# Altium footprint library bitfury.PcbLib: 41 footprints (part 1 of 3)
Each footprint in its own frame and in the unit in brackets; x right, y up, seen from the top. Pads: shape width x height; smd on the part's side, far side on the other; paste and mask are expansions set on the pad; w line width, h text height; cw(c..) or ccw(c..) is an arc to the next point about the centre after c.
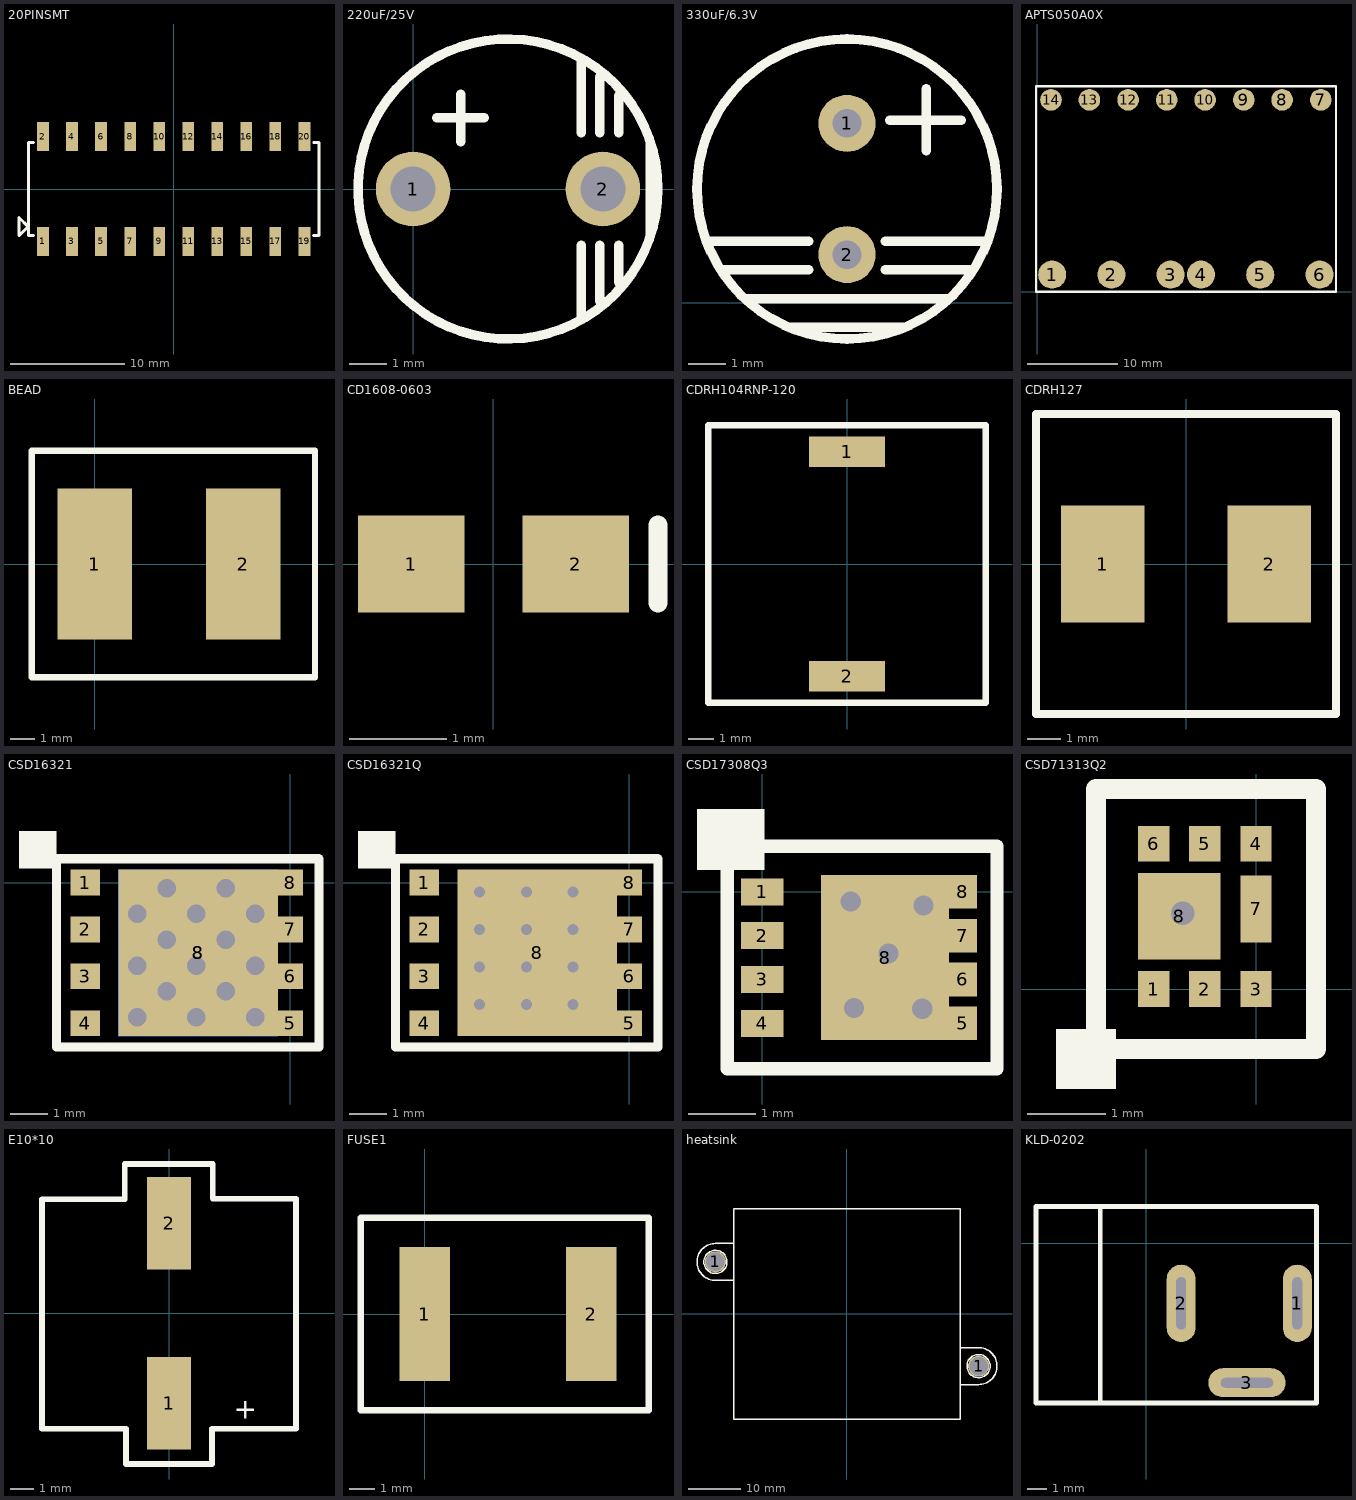
[diagram p0: the footprints below, top view; thin cyan lines are the x and y axes]

## 20PINSMT [mm]
pads (20):
  rect 1.02x2.534 smd: 1(-11.43,-4.573) 2(-11.43,4.573) 3(-8.89,-4.573) 4(-8.89,4.573) 5(-6.35,-4.573) 6(-6.35,4.573) 7(-3.81,-4.573) 8(-3.81,4.573) 9(-1.27,-4.573) 10(-1.27,4.573) 11(1.27,-4.573) 12(1.27,4.573) 13(3.81,-4.573) 14(3.81,4.573) 15(6.35,-4.573) 16(6.35,4.573) 17(8.89,-4.573) 18(8.89,4.573) 19(11.43,-4.573) 20(11.43,4.573)
Top Overlay:
  lines w0.254: -12.741,-3.302 -13.52,-4.082 -13.52,-2.489 -12.708,-3.302 ; -12.243,-4.05 -12.7,-4.05 -12.7,4.05 -12.243,4.05 ; 12.217,-4.05 12.7,-4.05 12.7,4.05 12.243,4.05
3D body: height 6.1, standoff 0, extent -12.548,-3.886 12.522,3.912

## 220uF/25V [mm] "aluminium electrolytic"
height 6
pads (2):
  round 2 hole 1.2: 1(0,0) 2(5.08,0)
Top Overlay:
  circle w0.254: c2.54,0 r4.016
  lines w0.254: 0.635,1.905 1.905,1.905 ; 1.27,1.27 1.27,2.54 ; 4.5,-3.5 4.5,-1.5 ; 4.5,1.5 4.5,3.5 ; 5,-3 5,-1.5 ; 5,1.5 5,3 ; 5.5,-2.5 5.5,-1.5 ; 5.5,1.5 5.5,2.5 ; 6.35,0.635 6.35,-1.27 6.35,1.27

## 330uF/6.3V [mil] "solid capacitors"
height 314.96
pads (2):
  round 60 hole 30: 1(-429.33,188.43) 2(-429.33,50.63)
Top Overlay:
  circle w10: c-429.33,119.53 r157.48
  lines w10: -574.33,64.53 -469.33,64.53 ; -559.33,34.53 -469.33,34.53 ; -534.33,4.53 -324.33,4.53 ; -489.33,-25.47 -369.33,-25.47 ; -389.33,34.53 -299.33,34.53 ; -389.33,64.53 -284.33,64.53 ; -384.33,191.53 -309.33,191.53 ; -346.33,159.53 -346.33,224.53

## APTS050A0X [mm] "DC-DC"
height 10
pads (14):
  round 3.12 smd: 1(1.65,1.91) 2(8.23,1.91) 3(14.81,1.91) 4(18.19,1.91) 5(24.77,1.91) 6(31.37,1.91)
  round 2.4 smd: 7(31.5,21.34) 8(27.2,21.34) 9(22.94,21.34) 10(18.64,21.34) 11(14.38,21.34) 12(10.08,21.34) 13(5.79,21.34) 14(1.52,21.34)
Top Overlay:
  lines w0.254: -0.15,0 -0.15,22.86 33.19,22.86 33.19,0 -0.15,0

## BEAD [mm]
pads (2):
  rect 3x6.1 smd: 1(0,0) 2(6,0)
Top Overlay:
  lines w0.254: -2.54,-4.572 -2.54,4.572 8.89,4.572 8.89,-4.318 8.89,-4.572 -2.54,-4.572

## CD1608-0603 [mm] "Chip Diode; Body 1.6 x 0.8 mm (LxW typ)"
height 0.85
pads (2):
  rect 1.1x1 smd: 1(-0.85,0) 2(0.85,0)
Top Overlay:
  lines w0.2: 1.7,-0.4 1.7,0.4

## CDRH104RNP-120 [mm]
pads (2):
  rect 3x1.2 smd: 1(0,4.45) 2(0,-4.45)
Top Overlay:
  lines w0.254: -5.5,-5.5 -5.5,5.5 5.5,5.5 5.5,-5.5 -5.5,-5.5

## CDRH127 [mm]
pads (2):
  rect 2.5x3.5 smd: 1(-2.5,0) 2(2.5,0)
Top Overlay:
  lines w0.254: -4.5,-4.5 4.5,-4.5 4.5,4.5 -4.5,4.5 -4.5,0 -4.5,-4.5

## CSD16321 [mm]
pads (10):
  rect 0.8x0.7 smd: 1(-5.565,0) 2(-5.565,-1.27) 3(-5.565,-2.54) 4(-5.565,-3.81)
  rect 0.68x0.7 smd: 5(0,-3.81) 6(0,-2.54) 7(0,-1.27) 8(0,0)
  rect 4.32x4.51 smd: 8(-2.5,-1.905)
  rect 4.32x4.51 smd far side: 8(-2.5,-1.905)
via -0.95,-2.25 diameter 0.8 hole 0.5
via -4.15,-0.85 diameter 0.8 hole 0.5
via -2.55,-0.85 diameter 0.8 hole 0.5
via -3.35,-0.15 diameter 0.8 hole 0.5
via -1.75,-0.15 diameter 0.8 hole 0.5
via -4.15,-2.25 diameter 0.8 hole 0.5
via -3.35,-1.55 diameter 0.8 hole 0.5
via -1.75,-1.55 diameter 0.8 hole 0.5
via -1.75,-2.95 diameter 0.8 hole 0.5
via -0.95,-3.65 diameter 0.8 hole 0.5
via -3.35,-2.95 diameter 0.8 hole 0.5
via -2.55,-3.65 diameter 0.8 hole 0.5
via -4.15,-3.65 diameter 0.8 hole 0.5
via -0.95,-0.85 diameter 0.8 hole 0.5
via -2.55,-2.25 diameter 0.8 hole 0.5
Top Overlay:
  rectangle: -7.355,0.381 -6.339,1.397
  lines w0.254: -6.339,-4.445 -6.339,0.635 -6.329,0.645 -5.833,0.645 0.267,0.645 0.509,0.645 0.763,0.645 0.773,0.635 0.773,-4.445 0.763,-4.455 0.267,-4.455 -5.833,-4.455 -6.329,-4.455 -6.339,-4.445

## CSD16321Q [mm]
pads (9):
  rect 0.8x0.7 smd: 1(-5.565,0) 2(-5.565,-1.27) 3(-5.565,-2.54) 4(-5.565,-3.81)
  rect 0.68x0.7 smd: 5(0,-3.81) 6(0,-2.54) 7(0,-1.27) 8(0,0)
  rect 4.32x4.51 smd: 8(-2.5,-1.905)
via -4.064,-0.254 diameter 0.6 hole 0.3
via -2.794,-0.254 diameter 0.6 hole 0.3
via -1.524,-0.254 diameter 0.6 hole 0.3
via -4.064,-1.27 diameter 0.6 hole 0.3
via -2.794,-1.27 diameter 0.6 hole 0.3
via -1.524,-1.27 diameter 0.6 hole 0.3
via -4.064,-2.286 diameter 0.6 hole 0.3
via -2.794,-2.286 diameter 0.6 hole 0.3
via -1.524,-2.286 diameter 0.6 hole 0.3
via -4.064,-3.302 diameter 0.6 hole 0.3
via -2.794,-3.302 diameter 0.6 hole 0.3
via -1.524,-3.302 diameter 0.6 hole 0.3
Top Overlay:
  rectangle: -7.355,0.381 -6.339,1.397
  lines w0.254: -6.339,-4.445 -6.329,-4.455 -5.833,-4.455 0.267,-4.455 0.763,-4.455 0.773,-4.445 0.773,0.635 0.763,0.645 0.509,0.645 0.267,0.645 -5.833,0.645 -6.329,0.645 -6.339,0.635 -6.339,-4.445

## CSD17308Q3 [mm] "POWER MOSFET"
pads (9):
  rect 0.63x0.4 smd: 1(0,0) 2(0,-0.65) 3(0,-1.3) 4(0,-1.95)
  rect 0.41x0.5 smd: 5(2.98,-1.95) 6(2.98,-1.3) 7(2.98,-0.65) 8(2.98,0)
  rect 1.9x2.45 smd: 8(1.825,-0.975)
via 2.395,-0.205 diameter 0.6 hole 0.3
via 1.875,-0.915 diameter 0.6 hole 0.3
via 1.315,-0.145 diameter 0.6 hole 0.3
via 1.365,-1.725 diameter 0.6 hole 0.3
via 2.375,-1.735 diameter 0.6 hole 0.3
Top Overlay:
  rectangle: -0.965,0.325 0.035,1.225
  lines w0.2: -0.515,-2.625 -0.515,0.675 3.485,0.675 3.485,-2.625 -0.515,-2.625

## CSD71313Q2 [mm] "N-MOSFET"
pads (8):
  rect 0.4x0.455 smd: 1(-1.3,0) 2(-0.65,0) 3(0,0) 4(0,1.845) 5(-0.65,1.845) 6(-1.3,1.845)
  rect 0.4x0.85 smd: 7(0,1.018)
  rect 1.05x1.1 smd: 8(-0.975,0.925)
via -0.93,0.96 diameter 0.6 hole 0.3
Top Overlay:
  rectangle: -2.54,-1.27 -1.778,-0.508
  lines w0.254: -2.032,-0.762 -2.032,2.54 0.508,2.54 0.762,2.54 0.762,-0.762 -1.778,-0.762

## E10*10 [mm]
pads (2):
  rect 1.9x4 smd: 1(0,-3.9) 2(0,3.9)
Top Overlay:
  lines w0.254: -5.5,-5 -2.333,-5 -1.858,-5 -1.858,-6.524 1.698,-6.524 1.858,-6.524 1.858,-5 2.333,-5 5.5,-5 5.5,4.962 1.914,4.962 1.896,4.98 1.896,6.468 1.66,6.468 1.642,6.468 -1.914,6.468 -1.914,6.214 -1.914,4.944 -5.5,4.944 -5.5,-5
  text "+" at 2.794,-4.572 h0.89
3D body: height 0.8, standoff 0, extent -3.984,-4.492 3.984,3.492
3D body: height 12.8, standoff 0.8, extent -3.968,-4.492 4,3.492

## FUSE1 [mm]
pads (2):
  rect 2x5.3 smd: 1(0,0) 2(6.6,0)
Top Overlay:
  lines w0.254: -2.54,-3.81 -2.54,3.81 8.89,3.81 8.89,-3.81 -2.54,-3.81

## heatsink [mm]
pads (2):
  round 4 hole 3.5: 1(-25,9.9) 1(25,-9.9)
Top Overlay:
  lines w0.254: -25.1,7.702 cw(c-25,9.9) -25,7.7 ; -25,13.4 ccw(c-25,9.9) -25,6.4 -21.5,6.4 ; -24.9,13.4 -21.5,13.4 ; 21.5,-13.4 25,-13.4 ccw(c25,-9.9) 25,-6.4 21.5,-6.4 ; 25,-7.7 ccw(c25,-9.9) 25.1,-7.702 ; -21.5,-20 21.5,-20 21.5,20 -21.5,20 -21.5,-20

## KLD-0202 [mm] "DC Power Jack, 2.5mm, KLD Series, PCB Mount"
pads (3):
  oval 1.5x4 hole 0.5 slot 2.7 at 90 deg: 1(7.8,-3.1) 2(1.8,-3.1)
  oval 4x1.5 hole 0.5 slot 2.7 at 0 deg: 3(5.2,-7.2)
Top Overlay:
  lines w0.254: -2.38,-8.2 -2.38,1.8 ; -5.7,-8.255 8.8,-8.255 8.8,1.9 -5.7,1.9 -5.7,-8.255
3D body: height 10, standoff 0.1, extent -5.9,-7.602 8.1,1.7